# Altium footprint library ST封装.PcbLib: 1336 footprints (part 38 of 109)
Each footprint in its own frame and in the unit in brackets; x right, y up, seen from the top. Pads: shape width x height; smd on the part's side, far side on the other; paste and mask are expansions set on the pad; w line width, h text height; cw(c..) or ccw(c..) is an arc to the next point about the centre after c.
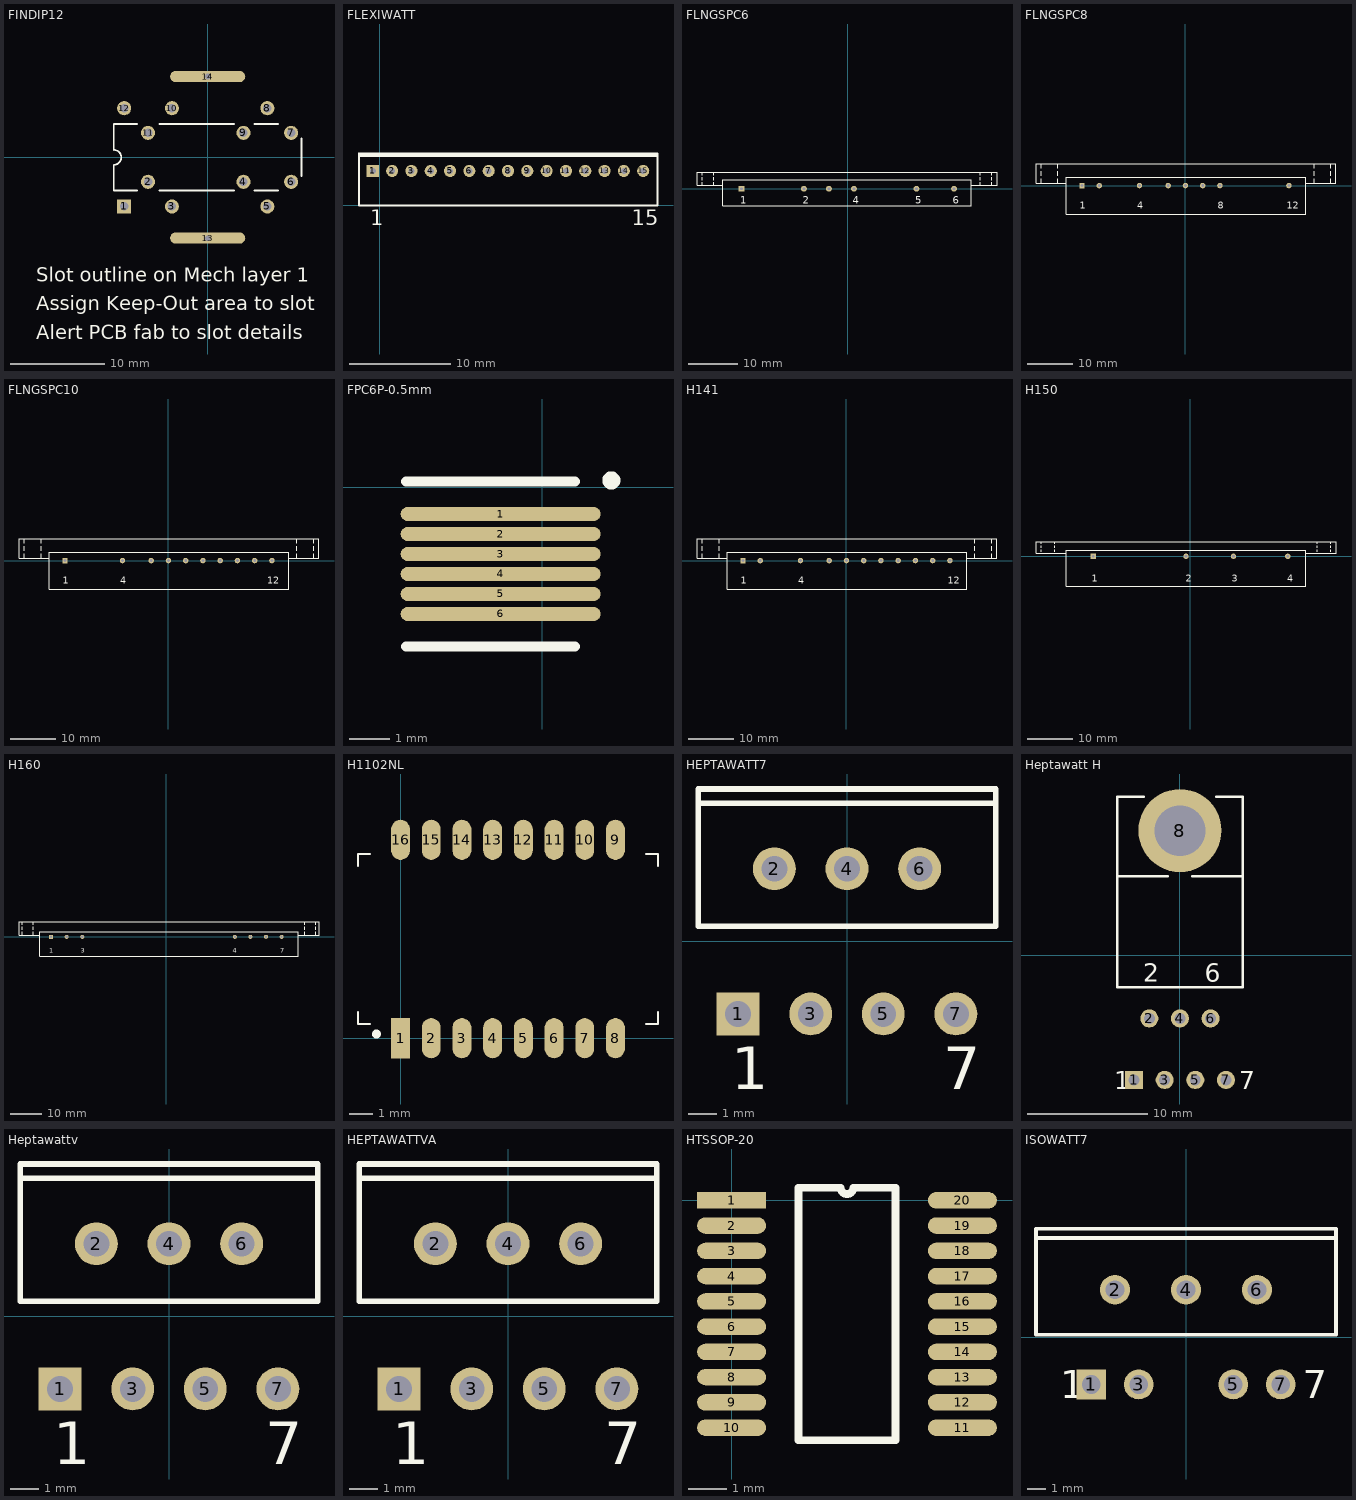
[diagram p37: the footprints below, top view; thin cyan lines are the x and y axes]

## FINDIP12 [mm] "QUIP; 12 Leads, in two Staggered Rows, plus 2 Heatsink tabs"
height 5.8
pads (14):
  rect 1.5x1.5 hole 0.9: 1(-8.89,-5.23)
  round 1.5 hole 0.9: 2(-6.35,-2.605) 3(-3.81,-5.23) 4(3.81,-2.605) 5(6.35,-5.23) 6(8.89,-2.605) 7(8.89,2.605) 8(6.35,5.23) 9(3.81,2.605) 10(-3.81,5.23) 11(-6.35,2.605) 12(-8.89,5.23)
  oval 8x1.2 hole 0.6: 13(0,-8.6) 14(0,8.6)
Top Overlay:
  lines w0.2: -7.5,-3.55 -10,-3.55 -10,-0.8 ccw(c-10,0) -10,0.8 -10,3.55 -7.5,3.55 ; -5.15,-3.55 2.8,-3.55 ; -5.15,3.55 2.8,3.55 ; 5,-3.55 7.5,-3.55 ; 5,3.55 7.5,3.55 ; 10,-2 10,2
  text "Slot outline on Mech layer 1" at -18.24,-13.25 h1.5
  text "Assign Keep-Out area to slot" at -18.24,-16.298 h1.5
  text "Alert PCB fab to slot details" at -18.24,-19.346 h1.5
Mechanical 1:
  lines w0.2: -3.3,-8.9 cw(c-3.3,-8.6) -3.3,-8.3 3.3,-8.3 cw(c3.3,-8.6) 3.3,-8.9 -3.3,-8.9 ; -3.3,8.3 cw(c-3.3,8.6) -3.3,8.9 3.3,8.9 cw(c3.3,8.6) 3.3,8.3 -3.3,8.3

## FLEXIWATT [mm] "SIP; 15 Leads; Body 29 x 4.6 mm (LxW typ); Pitch 1.91 mm"
height 17.1
pads (15):
  rect 1.2x1.2 hole 0.6: 1(-0.67,3.4)
  round 1.2 hole 0.6: 2(1.24,3.4) 3(3.15,3.4) 4(5.06,3.4) 5(6.97,3.4) 6(8.88,3.4) 7(10.79,3.4) 8(12.7,3.4) 9(14.61,3.4) 10(16.52,3.4) 11(18.43,3.4) 12(20.34,3.4) 13(22.25,3.4) 14(24.16,3.4) 15(26.07,3.4)
Top Overlay:
  rectangle: -2.135,4.8 27.535,5.2
  lines w0.2: -2.035,5.1 -2.035,0 27.465,0 27.465,5.1
  text "15" at 24.945,-1.975 h1.5
  text "1" at -0.92,-1.975 h1.5

## FLNGSPC6 [mm] "Rectangular Flange Mount, Thru-Hole; 6 Leads; Pitch 5.08 mm"
height 14.1
pads (6):
  rect 1.2x1.2 hole 0.6: 1(-21.59,0)
  round 1.2 hole 0.6: 2(-8.89,0) 3(-3.81,0) 4(1.27,0) 5(13.97,0) 6(21.59,0)
Top Overlay:
  lines w0.2: -29.55,0.75 -29.55,1.35 ; -29.55,1.75 -29.55,2.35 ; -29.55,2.75 -29.55,3.35 ; -27.15,0.75 -27.15,1.35 ; -27.15,1.75 -27.15,2.35 ; -27.15,2.75 -27.15,3.35 ; -25.385,0.75 -30.585,0.75 -30.585,3.35 30.315,3.35 30.315,0.75 25.115,0.75 ; 26.88,0.75 26.88,1.35 ; 26.88,1.75 26.88,2.35 ; 26.88,2.75 26.88,3.35 ; 29.28,0.75 29.28,1.35 ; 29.28,1.75 29.28,2.35 ; 29.28,2.75 29.28,3.35 ; -25.385,-3.45 -25.385,1.85 25.115,1.85 25.115,-3.45 -25.385,-3.45
  text "6" at 21.336,-3.048 h1.5
  text "5" at 13.716,-3.048 h1.5
  text "4" at 1.016,-3.048 h1.5
  text "2" at -9.144,-3.048 h1.5
  text "1" at -21.844,-3.048 h1.5

## FLNGSPC8 [mm] "Rectangular Flange Mount, Thru-Hole; 12 Leads (4 Absent); Pitch 3.81 mm"
height 22.3
pads (8):
  rect 1.2x1.2 hole 0.6: 1(-22.86,0)
  round 1.2 hole 0.6: 2(-19.05,0) 4(-10.16,0) 5(-3.81,0) 6(0,0) 7(3.81,0) 8(7.62,0) 12(22.86,0)
Top Overlay:
  lines w0.2: -31.88,0.55 -31.88,1.55 ; -31.88,2.2 -31.88,3.2 ; -31.88,3.85 -31.88,4.85 ; -28.18,0.55 -28.18,1.55 ; -28.18,2.2 -28.18,3.2 ; -28.18,3.85 -28.18,4.85 ; -26.38,0.55 -33.03,0.55 -33.03,4.85 33.27,4.85 33.27,0.55 26.62,0.55 ; 28.42,0.55 28.42,1.55 ; 28.42,2.2 28.42,3.2 ; 28.42,3.85 28.42,4.85 ; 32.12,0.55 32.12,1.55 ; 32.12,2.2 32.12,3.2 ; 32.12,3.85 32.12,4.85 ; -26.38,-6.35 26.62,-6.35 26.62,1.85 -26.38,1.85 -26.38,-6.35
  text "4" at -10.668,-5.08 h1.5
  text "12" at 22.352,-5.08 h1.5
  text "8" at 7.112,-5.08 h1.5
  text "1" at -23.368,-5.08 h1.5

## FLNGSPC10 [mm] "Rectangular Flange Mount, Thru-Hole; 12 Leads (2 Absent); Pitch 3.81 mm"
height 22.3
pads (10):
  rect 1.2x1.2 hole 0.6: 1(-22.86,0)
  round 1.2 hole 0.6: 4(-10.16,0) 5(-3.81,0) 6(0,0) 7(3.81,0) 8(7.62,0) 9(11.43,0) 10(15.24,0) 11(19.05,0) 12(22.86,0)
Top Overlay:
  lines w0.2: -31.88,0.55 -31.88,1.55 ; -31.88,2.2 -31.88,3.2 ; -31.88,3.85 -31.88,4.85 ; -28.13,0.55 -28.13,1.55 ; -28.13,2.2 -28.13,3.2 ; -28.13,3.85 -28.13,4.85 ; -26.38,0.55 -33.03,0.55 -33.03,4.85 33.27,4.85 33.27,0.55 26.62,0.55 ; 28.37,0.55 28.37,1.55 ; 28.37,2.2 28.37,3.2 ; 28.37,3.85 28.37,4.85 ; 32.12,0.55 32.12,1.55 ; 32.12,2.2 32.12,3.2 ; 32.12,3.85 32.12,4.85 ; -26.38,-6.35 26.62,-6.35 26.62,1.85 -26.38,1.85 -26.38,-6.35
  text "1" at -23.368,-5.08 h1.5
  text "4" at -10.668,-5.08 h1.5
  text "12" at 21.844,-5.08 h1.5

## FPC6P-0.5mm [mm]
pads (6):
  oval 5x0.35 smd: 1(-1.04,-0.673) 2(-1.04,-1.173) 3(-1.04,-1.673) 4(-1.04,-2.173) 5(-1.04,-2.673) 6(-1.04,-3.173)
Top Overlay:
  circle w0.254: c1.727,0.167 r0.1
  lines w0.254: -3.403,-3.984 0.811,-3.984 ; -3.403,0.138 0.811,0.138
3D body: height 0.2, standoff 0, extent -3.429,-3.937 0.889,0.127

## H141 [mm] "Rectangular Flange Mount, Thru-Hole; 12 Leads (1 Absent); Pitch 3.81 mm"
height 22.3
pads (11):
  rect 1.2x1.2 hole 0.6: 1(-22.86,0)
  round 1.2 hole 0.6: 2(-19.05,0) 4(-10.16,0) 5(-3.81,0) 6(0,0) 7(3.81,0) 8(7.62,0) 9(11.43,0) 10(15.24,0) 11(19.05,0) 12(22.86,0)
Top Overlay:
  lines w0.2: -31.88,0.55 -31.88,1.55 ; -31.88,2.2 -31.88,3.2 ; -31.88,3.85 -31.88,4.85 ; -28.13,0.55 -28.13,1.55 ; -28.13,2.2 -28.13,3.2 ; -28.13,3.85 -28.13,4.85 ; -26.38,0.55 -33.03,0.55 -33.03,4.85 33.27,4.85 33.27,0.55 26.62,0.55 ; 28.37,0.55 28.37,1.55 ; 28.37,2.2 28.37,3.2 ; 28.37,3.85 28.37,4.85 ; 32.12,0.55 32.12,1.55 ; 32.12,2.2 32.12,3.2 ; 32.12,3.85 32.12,4.85 ; -26.38,-6.35 -26.38,1.85 26.62,1.85 26.62,-6.35 -26.38,-6.35
  text "12" at 22.352,-5.08 h1.5
  text "4" at -10.668,-5.08 h1.5
  text "1" at -23.368,-5.08 h1.5

## H150 [mm] "Rectangular Flange Mount, Thru-Hole; 4 Leads; Pitch 12 mm"
height 23.2
pads (4):
  rect 1.2x1.2 hole 0.6: 1(-21.5,0)
  round 1.2 hole 0.6: 2(-0.99,0) 3(9.5,0) 4(21.5,0)
Top Overlay:
  lines w0.2: -33.01,0.964 -33.01,1.464 ; -33.01,1.864 -33.01,2.364 ; -33.01,2.75 -33.01,3.25 ; -30.01,0.964 -30.01,1.464 ; -30.01,1.864 -30.01,2.364 ; -30.01,2.75 -30.01,3.25 ; -27.44,0.65 -34.14,0.65 -34.14,3.25 32.16,3.25 32.16,0.65 25.46,0.65 ; 28.03,0.964 28.03,1.464 ; 28.03,1.864 28.03,2.364 ; 28.03,2.75 28.03,3.25 ; 31.03,0.964 31.03,1.464 ; 31.03,1.864 31.03,2.364 ; 31.03,2.75 31.03,3.25 ; -27.44,-6.65 25.46,-6.65 25.46,1.35 -27.44,1.35 -27.44,-6.65
  text "4" at 21.336,-5.588 h1.5
  text "3" at 9.144,-5.588 h1.5
  text "2" at -1.016,-5.588 h1.5
  text "1" at -21.844,-5.588 h1.5

## H160 [mm] "Rectangular Flange Mount, Thru-Hole; 7 Leads; Pitch 5 mm"
height 25.7
pads (7):
  rect 1.3x1.3 hole 0.7: 1(-36.99,0)
  round 1.3 hole 0.7: 2(-31.99,0) 3(-26.99,0) 4(21.99,0) 5(26.99,0) 6(31.99,0) 7(36.99,0)
Top Overlay:
  lines w0.2: -46.3,0.65 -46.3,1.65 ; -46.3,2.25 -46.3,3.25 ; -46.3,3.85 -46.3,4.85 ; -42.78,0.65 -42.78,1.65 ; -42.78,2.25 -42.78,3.25 ; -42.78,3.85 -42.78,4.85 ; -40.705,0.55 -47.3,0.55 -47.3,4.85 49,4.85 49,0.55 42.395,0.55 ; 44.48,0.65 44.48,1.65 ; 44.48,2.25 44.48,3.25 ; 44.48,3.85 44.48,4.85 ; 48,0.65 48,1.65 ; 48,2.25 48,3.25 ; 48,3.85 48,4.85 ; -40.705,-6.25 -40.705,1.674 42.395,1.674 42.395,-6.25 -40.705,-6.25
  text "7" at 36.576,-5.08 h1.5
  text "4" at 21.336,-5.08 h1.5
  text "3" at -27.432,-5.08 h1.5
  text "1" at -37.592,-5.08 h1.5

## H1102NL [mm]
height 1.6
pads (16):
  rect 0.8x1.7 smd mask+0.07: 1(0,0)
  oval 0.8x1.7 smd mask+0.07: 2(1.3,0) 3(2.6,0) 4(3.9,0) 5(5.2,0) 6(6.5,0) 7(7.8,0) 8(9.1,0) 9(9.1,8.4) 10(7.8,8.4) 11(6.5,8.4) 12(5.2,8.4) 13(3.9,8.4) 14(2.6,8.4) 15(1.3,8.4) 16(0,8.4)
Top Overlay:
  circle w0.2: c-1.016,0.178 r0.09
  lines w0.1: -1.8,1.1 -1.8,0.6 -1.3,0.6 ; -1.8,7.3 -1.8,7.8 -1.3,7.8 ; 10.4,0.6 10.9,0.6 10.9,1.1 ; 10.4,7.8 10.9,7.8 10.9,7.3
3D body "SOP-16.STEP": height 1.6, standoff 0, extent -0.475,2.443 9.525,8.708
3D body "SOP-16.STEP": height 1.6, standoff 0, extent -0.475,-0.107 9.525,6.158
3D body: height 5, standoff 0, extent -0.475,0.587 9.525,7.912

## HEPTAWATT7 [mm] "TO, Thru-Hole, Vertical, Heatsink Mounted; 7 Bent Staggered Leads; Pitch 1.27 mm"
height 20.2
pads (7):
  rect 1.5x1.5 hole 0.9: 1(-3.81,-2.54)
  round 1.5 hole 0.9: 2(-2.54,2.54) 3(-1.27,-2.54) 4(0,2.54) 5(1.27,-2.54) 6(2.54,2.54) 7(3.81,-2.54)
Top Overlay:
  lines w0.2: -5.2,4.83 5.2,4.83 ; -5.2,0.53 -5.2,5.33 5.2,5.33 5.2,0.53 -5.2,0.53
  text "1" at -4.05,-5.165 h1.5
  text "7" at 3.37,-5.165 h1.5

## Heptawatt H [mm] "TO, Thru-Hole, Horizontal, Heatsink Mounted; 7 Bent Staggered Leads; Pitch 1.27 mm"
height 4.8
pads (8):
  rect 1.5x1.5 hole 0.9: 1(-3.81,-10.34)
  round 1.5 hole 0.9: 2(-2.54,-5.24) 3(-1.27,-10.34) 4(0,-5.24) 5(1.27,-10.34) 6(2.54,-5.24) 7(3.81,-10.34)
  round 6.9 hole 4.2: 8(0,10.34)
Top Overlay:
  lines w0.2: -5.2,6.54 -1,6.54 ; -3,13.14 -5.2,13.14 -5.2,-2.66 5.2,-2.66 5.2,13.14 3,13.14 ; 1,6.54 5.2,6.54
  text "2" at -3.04,-2.185 h1.5
  text "6" at 2.04,-2.185 h1.5
  text "7" at 4.935,-11.09 h1.5
  text "1" at -5.435,-11.09 h1.5

## Heptawattv [mm] "TO, Thru-Hole, Vertical, Heatsink Mounted; 7 Bent Staggered Leads; Pitch 1.27 mm"
height 20.1
pads (7):
  rect 1.5x1.5 hole 0.9: 1(-3.81,-2.54)
  round 1.5 hole 0.9: 2(-2.54,2.54) 3(-1.27,-2.54) 4(0,2.54) 5(1.27,-2.54) 6(2.54,2.54) 7(3.81,-2.54)
Top Overlay:
  lines w0.2: -5.2,4.83 5.2,4.83 ; -5.2,0.53 -5.2,5.33 5.2,5.33 5.2,0.53 -5.2,0.53
  text "1" at -4.05,-5.165 h1.5
  text "7" at 3.37,-5.165 h1.5

## HEPTAWATTVA [mm] "TO, Thru-Hole, Vertical, Heatsink Mounted; 7 Bent Staggered Leads; Pitch 1.27 mm"
height 20.2
pads (7):
  rect 1.5x1.5 hole 0.9: 1(-3.81,-2.54)
  round 1.5 hole 0.9: 2(-2.54,2.54) 3(-1.27,-2.54) 4(0,2.54) 5(1.27,-2.54) 6(2.54,2.54) 7(3.81,-2.54)
Top Overlay:
  lines w0.2: -5.2,4.83 5.2,4.83 ; -5.2,0.53 -5.2,5.33 5.2,5.33 5.2,0.53 -5.2,0.53
  text "1" at -4.05,-5.165 h1.5
  text "7" at 3.37,-5.165 h1.5

## HTSSOP-20 [mm]
pads (20):
  rect 1.78x0.42 smd: 1(0,0)
  oval 1.78x0.42 smd: 2(0,-0.65) 3(0,-1.3) 4(0,-1.95) 5(0,-2.6) 6(0,-3.25) 7(0,-3.9) 8(0,-4.55) 9(0,-5.2) 10(0,-5.85) 11(5.94,-5.85) 12(5.94,-5.2) 13(5.94,-4.55) 14(5.94,-3.9) 15(5.94,-3.25) 16(5.94,-2.6) 17(5.94,-1.95) 18(5.94,-1.3) 19(5.94,-0.65) 20(5.94,0)
Top Overlay:
  lines w0.2: 1.725,-6.175 4.215,-6.175 4.215,0.325 3.132,0.325 cw(c2.97,0.325) 2.808,0.325 1.725,0.325 1.725,-6.175
3D body: height 0.25, standoff 0, extent -2.95,-1.475 -2.95,-1.475
3D body "User Library-HTSSOP20 (1).step": height 0.95, standoff -0.06, extent -0.232,-6.2 6.182,0.3

## ISOWATT7 [mm] "TO, Thru-Hole, Vertical, Heatsink Mounted; 7 Bent Staggered Leads; Pitch 1.27 mm"
height 25.3
pads (7):
  rect 1.6x1.6 hole 1: 1(-5.08,-2.54)
  round 1.6 hole 1: 2(-3.81,2.54) 3(-2.54,-2.54) 4(0,2.54) 5(2.54,-2.54) 6(3.81,2.54) 7(5.08,-2.54)
Top Overlay:
  lines w0.2: -8.05,5.32 8.05,5.32 ; -8.05,0.12 -8.05,5.82 8.05,5.82 8.05,0.12 -8.05,0.12
  text "1" at -6.755,-3.29 h1.5
  text "7" at 6.255,-3.29 h1.5